# Altium footprint library USER_Lib.PcbLib: 109 footprints (part 6 of 7)
Each footprint in its own frame and in the unit in brackets; x right, y up, seen from the top. Pads: shape width x height; smd on the part's side, far side on the other; paste and mask are expansions set on the pad; w line width, h text height; cw(c..) or ccw(c..) is an arc to the next point about the centre after c.
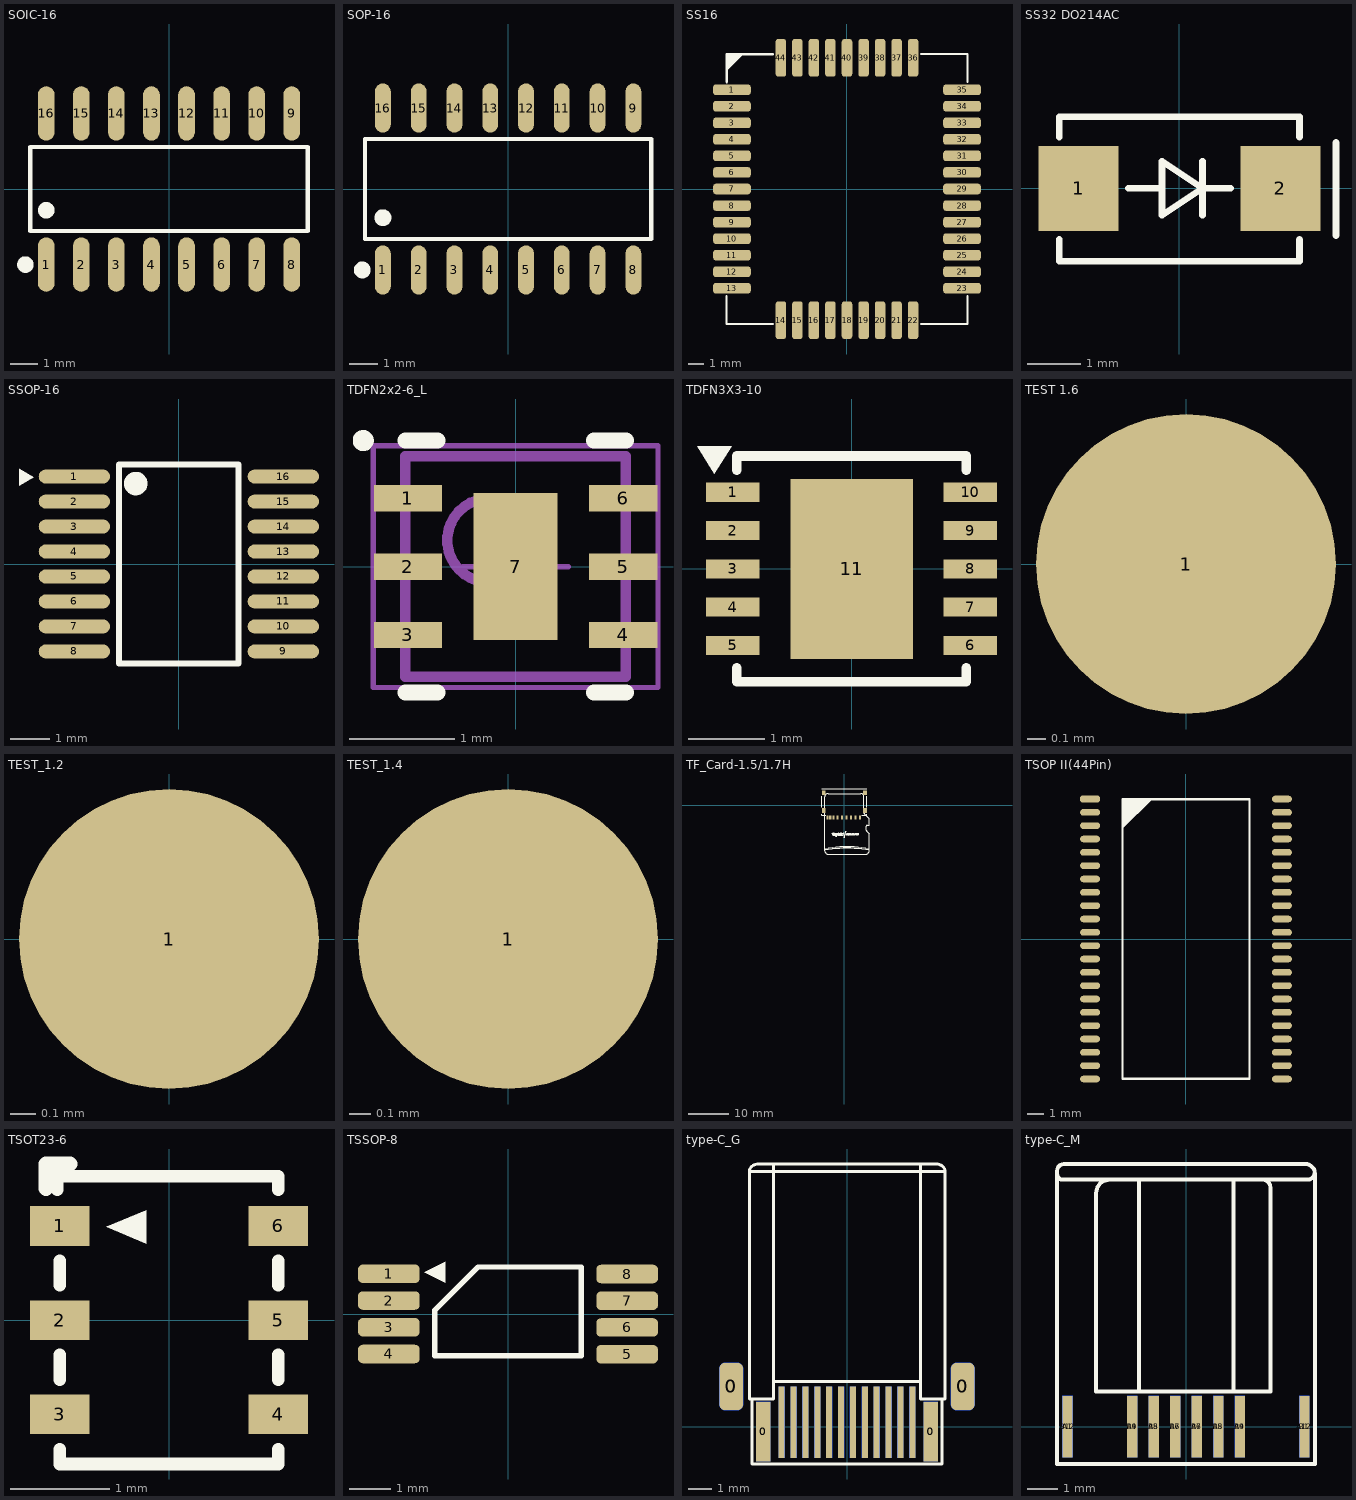
[diagram p5: the footprints below, top view; thin cyan lines are the x and y axes]

## SOIC-16 [mm]
pads (16):
  oval 0.602x1.971 smd: 1(-4.445,-2.736) 2(-3.175,-2.736) 3(-1.905,-2.736) 4(-0.635,-2.736) 5(0.635,-2.736) 6(1.905,-2.736) 7(3.175,-2.736) 8(4.445,-2.736) 9(4.445,2.736) 10(3.175,2.736) 11(1.905,2.736) 12(0.635,2.736) 13(-0.635,2.736) 14(-1.905,2.736) 15(-3.175,2.736) 16(-4.445,2.736)
Top Overlay:
  circle w0.3: c-4.445,-0.769 r0.15
  circle w0.3: c-5.198,-2.736 r0.15
  lines w0.152: -5.026,-1.521 -5.026,1.521 5.026,1.521 5.026,-1.521 -5.026,-1.521

## SOP-16 [mm]
pads (16):
  oval 0.56x1.745 smd: 1(-4.445,-2.873) 2(-3.175,-2.873) 3(-1.905,-2.873) 4(-0.635,-2.873) 5(0.635,-2.873) 6(1.905,-2.873) 7(3.175,-2.873) 8(4.445,-2.873) 9(4.445,2.873) 10(3.175,2.873) 11(1.905,2.873) 12(0.635,2.873) 13(-0.635,2.873) 14(-1.905,2.873) 15(-3.175,2.873) 16(-4.445,2.873)
Top Overlay:
  circle w0.3: c-4.445,-1.019 r0.15
  circle w0.3: c-5.177,-2.872 r0.15
  lines w0.152: -5.076,-1.771 -5.076,1.771 5.076,1.771 5.076,-1.771 -5.076,-1.771

## SS16 [mm]
pads (44):
  rrect50% 2.5x0.7 smd mask+0.102: 1(-7.65,6.6) 2(-7.65,5.5) 3(-7.65,4.4) 4(-7.65,3.3) 5(-7.65,2.2) 6(-7.65,1.1) 7(-7.65,0) 8(-7.65,-1.1) 9(-7.65,-2.2) 10(-7.65,-3.3) 11(-7.65,-4.4) 12(-7.65,-5.5) 13(-7.65,-6.6) 23(7.65,-6.6) 24(7.65,-5.5) 25(7.65,-4.4) 26(7.65,-3.3) 27(7.65,-2.2) 28(7.65,-1.1) 29(7.65,0) 30(7.65,1.1) 31(7.65,2.2) 32(7.65,3.3) 33(7.65,4.4) 34(7.65,5.5) 35(7.65,6.6)
  rrect50% 0.7x2.5 smd mask+0.102: 14(-4.4,-8.725) 15(-3.3,-8.725) 16(-2.2,-8.725) 17(-1.1,-8.725) 18(0,-8.725) 19(1.1,-8.725) 20(2.2,-8.725) 21(3.3,-8.725) 22(4.4,-8.725) 36(4.4,8.725) 37(3.3,8.725) 38(2.2,8.725) 39(1.1,8.725) 40(0,8.725) 41(-1.1,8.725) 42(-2.2,8.725) 43(-3.3,8.725) 44(-4.4,8.725)
Top Overlay:
  region: -8.065,7.112 -8.065,8.966 -8.065,8.979 -8.055,9.002 -8.037,9.02 -8.014,9.03 -8.001,9.03 -4.928,9.03 -4.915,9.03 -4.891,9.02 -4.873,9.002 -4.864,8.979 -4.864,8.966 -4.864,8.953 -4.873,8.93 -4.891,8.912 -4.915,8.902 -4.928,8.902 -6.959,8.902 -7.937,7.924 -7.937,7.112 -7.937,7.086 -7.975,7.048 -8.027,7.048 -8.065,7.086
  lines w0.127: -8.001,-7.112 -8.001,-8.966 -4.928,-8.966 ; 4.928,-8.966 8.001,-8.966 8.001,-7.112 ; 4.928,8.966 8.001,8.966 8.001,7.112
3D body "SS16.STEP": height 2, standoff 0, extent -7.9,-8.85 7.9,8.85

## SS32 DO214AC [mm]
pads (2):
  rect 1.5x1.6 smd mask+0.102: 1(-1.9,0) 2(1.9,0)
Top Overlay:
  lines w0.127: -2.261,-0.965 -2.261,-1.372 2.261,-1.372 2.261,-0.965 ; -2.261,0.965 -2.261,1.346 2.261,1.346 2.261,0.965 ; -0.965,0 -0.33,0 ; 0.432,-0.508 0.432,0.508 ; 0.965,0 0.432,0 ; 2.946,-0.889 2.946,0.864 ; 0.432,0 -0.33,0.508 -0.33,-0.508 0.432,0
3D body "SS32 DO214AC.STEP": height 2.2, standoff 0, extent -2.25,-1.35 2.25,1.35

## SSOP-16 [mil]
pads (16):
  oval 71.45x14 smd: 1(-104.52,87.5) 2(-104.52,62.5) 3(-104.52,37.5) 4(-104.52,12.5) 5(-104.52,-12.5) 6(-104.52,-37.5) 7(-104.52,-62.5) 8(-104.52,-87.5) 9(104.52,-87.5) 10(104.52,-62.5) 11(104.52,-37.5) 12(104.52,-12.5) 13(104.52,12.5) 14(104.52,37.5) 15(104.52,62.5) 16(104.52,87.5)
Top Overlay:
  circle w11.81: c-43.18,80.5 r5.91
  region: -160,78.5 -160,95.5 -145,87
  lines w6: -59.8,-99.56 59.8,-99.56 59.8,99.56 -59.8,99.56 -59.8,-99.56

## TDFN2x2-6_L [mm]
height 0.9
pads (7):
  rect 0.65x0.25 smd: 1(-1.025,0.65) 2(-1.025,0) 3(-1.025,-0.65) 4(1.025,-0.65) 5(1.025,0) 6(1.025,0.65)
  rect 0.8x1.4 smd: 7(0,0)
Top Overlay:
  circle w0.1: c-1.45,1.2 r0.05
  lines w0.152: -1.05,-1.2 -0.745,-1.2 ; -1.05,1.2 -0.745,1.2 ; 0.745,-1.2 1.05,-1.2 ; 0.745,1.2 1.05,1.2
Mechanical 13:
  circle w0.1: c-0.25,0.25 r0.4
  lines w0.1: -1.05,-1.05 1.05,-1.05 1.05,1.05 -1.05,1.05 -1.05,-1.05
Mechanical 15:
  circle w0.05: c0,0 r0.35
  lines w0.05: -0.5,0 0.5,0 ; 0,-0.5 0,0.5 ; -1.355,-1.15 1.355,-1.15 1.355,1.15 -1.355,1.15 -1.355,-1.15
3D body "SON65P200X80_HS-7L.step": height 0.8, standoff 0, extent -1.15,-1.05 1.15,1.05

## TDFN3X3-10 [mm]
pads (11):
  rect 0.7x0.25 smd mask+0.102: 1(-1.55,1) 2(-1.55,0.5) 3(-1.55,0) 4(-1.55,-0.5) 5(-1.55,-1) 6(1.55,-1) 7(1.55,-0.5) 8(1.55,0) 9(1.55,0.5) 10(1.55,1)
  rect 1.6x2.35 smd mask+0.102: 11(0,0)
Top Overlay:
  region: -1.791,1.245 -2.019,1.6 -1.562,1.6
  lines w0.127: -1.5,-1.291 -1.5,-1.473 1.5,-1.473 1.5,-1.291 ; -1.5,1.291 -1.5,1.473 1.5,1.473 1.5,1.291
3D body "22222.stp": height 0.72, standoff -0.04, extent -1.51,-1.5 1.51,1.5

## TEST 1.6 [mm]
pads (1):
  round 1.6 smd mask+0.102: 1(0,0)

## TEST_1.2 [mm]
pads (1):
  round 1.2 smd mask+0.102: 1(0,0)

## TEST_1.4 [mm]
pads (1):
  round 1.4 smd mask+0.102: 1(0,0)

## TF_Card-1.5/1.7H [mm] "简易短体9P，带侦测引脚"
pads (13):
  rect 0.5x1 smd: 1(3.85,-3.1) 2(2.75,-3.1) 3(1.65,-3.1) 4(0.55,-3.1) 5(-0.55,-3.1) 6(-1.65,-3.1) 7(-2.75,-3.1) 8(-3.5,-3.1) 9(-4.2,-3.1)
  rect 0.95x1.2 smd: 10(-5.1,-1.35) 10(-5.1,3.1) 10(5.1,-1.35) 10(5.1,3.1)
Top Overlay:
  drawing of 833 lines, arcs and shapes, not listed

## TSOP II(44Pin) [mm]
pads (44):
  oct 1.2x0.4 smd: 1(-5.753,8.4)
  oval 1.2x0.4 smd: 2(-5.753,7.6) 3(-5.753,6.8) 4(-5.753,6) 5(-5.753,5.2) 6(-5.753,4.4) 7(-5.753,3.6) 8(-5.753,2.8) 9(-5.753,2) 10(-5.753,1.2) 11(-5.753,0.4) 12(-5.753,-0.4) 13(-5.753,-1.2) 14(-5.753,-2) 15(-5.753,-2.8) 16(-5.753,-3.6) 17(-5.753,-4.4) 18(-5.753,-5.2) 19(-5.753,-6) 20(-5.753,-6.8) 21(-5.753,-7.6) 22(-5.753,-8.4) 23(5.753,-8.4) 24(5.753,-7.6) 25(5.753,-6.8) 26(5.753,-6) 27(5.753,-5.2) 28(5.753,-4.4) 29(5.753,-3.6) 30(5.753,-2.8) 31(5.753,-2) 32(5.753,-1.2) 33(5.753,-0.4) 34(5.753,0.4) 35(5.753,1.2) 36(5.753,2) 37(5.753,2.8) 38(5.753,3.6) 39(5.753,4.4) 40(5.753,5.2) 41(5.753,6) 42(5.753,6.8) 43(5.753,7.6) 44(5.753,8.4)
Top Overlay:
  region: -3.81,8.382 -2.032,8.382 -3.81,6.604
  lines w0.127: -3.81,-8.382 -3.81,0 -3.81,8.382 3.81,8.382 3.81,0 3.81,-8.382 -3.81,-8.382
3D body "User Library-TSOP2-44.STEP": height 1.3, standoff -0.4, extent -5.867,-9.105 5.893,9.105

## TSOT23-6 [mm]
pads (6):
  rect 0.6x0.4 smd mask+0.102: 1(-1.1,0.95) 2(-1.1,0) 3(-1.1,-0.95) 4(1.1,-0.95) 5(1.1,0) 6(1.1,0.95)
Top Overlay:
  region: -0.635,0.94 -0.229,1.107 -0.229,0.772
  lines w0.127: -1.241,1.575 -1.111,1.575 -1.111,1.445 ; -1.125,1.314 -1.125,1.45 ; -1.1,-1.303 -1.1,-1.45 1.1,-1.45 1.1,-1.303 ; -1.1,-0.603 -1.1,-0.349 ; -1.1,0.351 -1.1,0.597 ; -1.1,1.45 1.1,1.45 1.1,1.314 ; 1.1,-0.603 1.1,-0.349 ; 1.1,0.351 1.1,0.597
  lines w0.152: -1.241,1.328 -1.241,1.575 -0.998,1.575

## TSSOP-8 [mm]
pads (8):
  rrect50% 1.5x0.45 smd mask+0.102: 1(-2.896,0.978) 2(-2.896,0.328) 3(-2.896,-0.322) 4(-2.896,-0.972) 5(2.896,-0.978) 6(2.896,-0.328) 7(2.896,0.322) 8(2.896,0.972)
Top Overlay:
  region: -2.032,1.016 -1.524,0.762 -1.524,1.27
  lines w0.127: -1.778,-1.016 1.778,-1.016 1.778,1.143 0,1.143 -0.729,1.143 -1.778,0.094 -1.778,-1.016

## type-C_G [mm] "type-C公头         夹板24P"
pads (32):
  rrect50% 1x2 smd: 0(-4.877,1.702) 0(4.877,1.702)
  rrect50% 1x2 smd far side: 0(-4.877,1.702) 0(4.877,1.702)
  rect 0.6x2.5 smd: 0(-3.525,-0.2) 0(3.525,-0.2)
  rect 0.6x2.5 smd far side: 0(-3.525,-0.2) 0(3.525,-0.2)
  rect 0.25x3 smd: A1(-2.75,0.2) A2(-2.25,0.2) A3(-1.75,0.2) A4(-1.25,0.2) A5(-0.75,0.2) A6(-0.25,0.2) A7(0.25,0.2) A8(0.75,0.2) A9(1.25,0.2) A10(1.75,0.2) A11(2.25,0.2) A12(2.75,0.2)
  rect 0.25x3 smd far side: B1(2.75,0.2) B2(2.25,0.2) B3(1.75,0.2) B4(1.25,0.2) B5(0.75,0.2) B6(0.25,0.2) B7(-0.25,0.2) B8(-0.75,0.2) B9(-1.25,0.2) B10(-1.75,0.2) B11(-2.25,0.2) B12(-2.75,0.2)
Top Overlay:
  lines w0.127: -3.8,11.068 3.785,11.068 cw(c3.785,10.718) 4.135,10.718 4.135,1.168 4,1.168 ; -3.8,11.07 ccw(c-3.759,10.713) -4.115,10.763 ; -3.087,11.069 cw(c-3.087,11.069) -3.087,11.069 -3.087,10.573 -3.087,1.905 ; 3.983,1.168 4,1.168 ; 4.132,10.764 cw(c4.131,10.764) 4.131,10.763 -4.115,10.763 ; -4.115,10.763 -4.115,1.168 -3.987,1.168 ; -3.987,1.168 -4,1.168 -4,1.092 -4,-1.562 0,-1.562 4,-1.562 4,1.092 4,1.168 ; -3.987,1.168 -3.771,1.168 -3.087,1.168 -3.087,1.905 ; -3.087,1.905 0,1.905 3.087,1.905 ; 3.087,1.905 3.087,1.168 3.771,1.168 3.987,1.168 4,1.168 ; 3.087,1.905 3.087,10.623 3.087,11.063 ; 3.087,11.063 ccw(c3.086,11.063) 3.086,11.064
Bottom Overlay:
  lines w0.076: -3.8,11.068 3.785,11.068 cw(c3.785,10.718) 4.135,10.718 4.135,1.168 4,1.168 ; -3.8,11.07 ccw(c-3.759,10.713) -4.115,10.763 ; -3.087,11.069 cw(c-3.087,11.069) -3.087,11.069 -3.087,10.573 -3.087,1.905 ; 3.983,1.168 4,1.168 ; 4.132,10.764 cw(c4.131,10.764) 4.131,10.763 -4.115,10.763 ; -4.115,10.763 -4.115,1.168 -3.987,1.168 ; -3.987,1.168 -4,1.168 -4,1.092 -4,-1.562 0,-1.562 4,-1.562 4,1.092 4,1.168 ; -3.987,1.168 -3.771,1.168 -3.087,1.168 -3.087,1.905 ; -3.087,1.905 0,1.905 3.087,1.905 ; 3.087,1.905 3.087,1.168 3.771,1.168 3.987,1.168 4,1.168 ; 3.087,1.905 3.087,10.623 3.087,11.063 ; 3.087,11.063 ccw(c3.086,11.063) 3.086,11.064

## type-C_M [mm] "type-C母头       夹板16P"
pads (16):
  rect 0.33x2 smd mask+0.102: A1(-3.848,0) A4(-1.748,0) A5(-1.048,0) A6(-0.348,0) A7(0.352,0) A8(1.052,0) A9(1.752,0) A12(3.852,0)
  rect 0.33x2 smd far side mask+0.102: B1(3.848,0) B4(1.748,0) B5(1.048,0) B6(0.348,0) B7(-0.352,0) B8(-1.052,0) B9(-1.752,0) B12(-3.852,0)
Top Overlay:
  lines w0.127: -4.192,8.216 ccw(c-4.003,8.216) -4.003,8.026 -2.489,8.026 ; -1.524,1.143 -1.524,8.026 ; 1.549,1.143 1.549,8.026 ; 4.186,8.266 cw(c3.946,8.266) 3.946,8.026 2.489,8.026 ; -2.489,8.026 ccw(c-2.489,7.595) -2.921,7.595 -2.921,1.143 2.743,1.143 2.743,7.772 ccw(c2.489,7.772) 2.489,8.026 ; -2.489,8.026 2.489,8.026 ; -4.191,-1.219 0,-1.219 4.191,-1.219 4.191,8.23 ccw(c3.886,8.23) 3.886,8.534 cw(c3.884,8.534) 3.884,8.532 -3.975,8.532 ccw(c-3.975,8.316) -4.191,8.316 -4.191,7.188 -4.191,-1.219